# Altium footprint library LimeMicroAltiumLib_pcbLib.PcbLib: 281 footprints (part 16 of 18)
Each footprint in its own frame and in the unit in brackets; x right, y up, seen from the top. Pads: shape width x height; smd on the part's side, far side on the other; paste and mask are expansions set on the pad; w line width, h text height; cw(c..) or ccw(c..) is an arc to the next point about the centre after c.
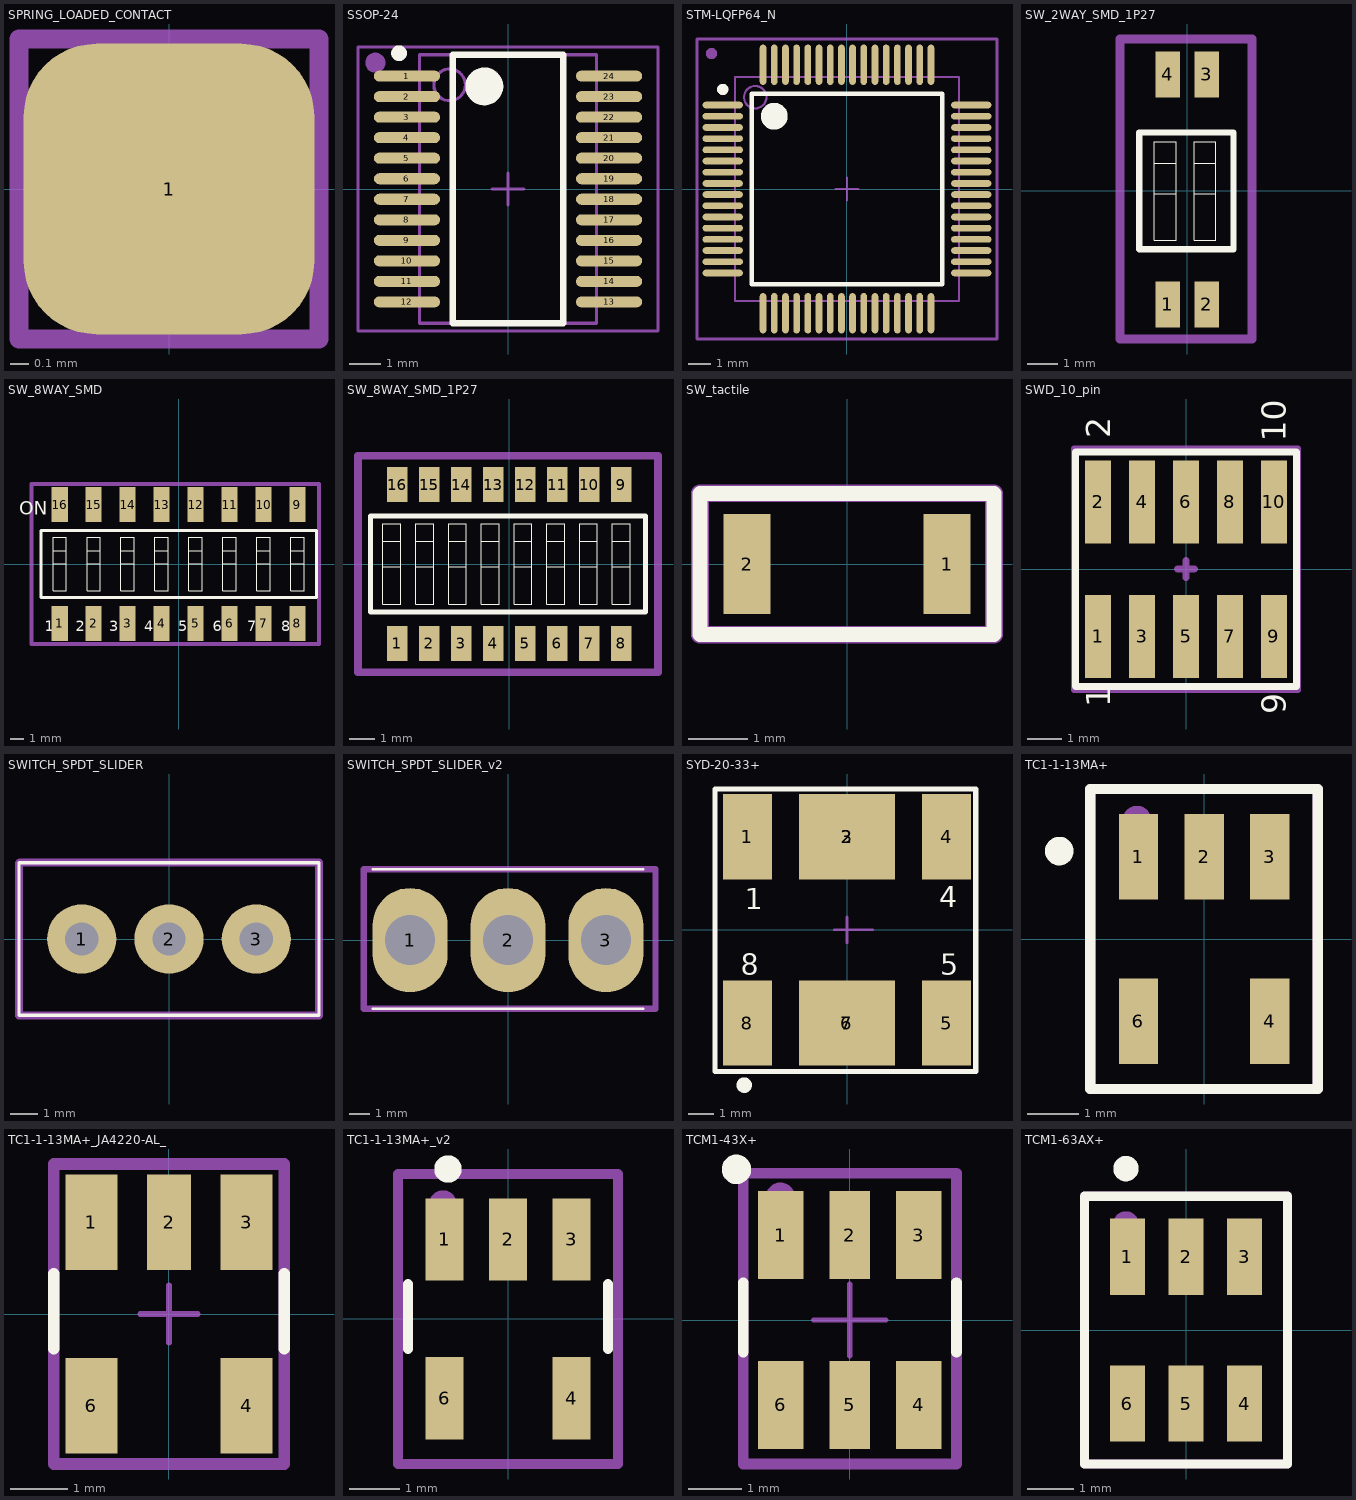
[diagram p15: the footprints below, top view; thin cyan lines are the x and y axes]

## SPRING_LOADED_CONTACT [mm]
pads (1):
  rrect50% 1.55x1.55 smd mask+0.05: 1(0,0)
Mechanical 15:
  lines w0.1: -0.425,0 0,0 ; 0,-0.425 0,0 ; 0,0.425 0,0 ; 0.425,0 0,0 ; -0.8,-0.8 0.8,-0.8 0.8,0.8 -0.8,0.8 -0.8,-0.8
  text ".Designator" at 0,0 h0.55
3D body: height 4, standoff 2, extent -0.3,-0.3 0.3,0.3
3D body: height 2, standoff 0, extent -0.6,-0.6 0.6,0.6

## SSOP-24 [mm] "SOP, 24-Leads, Body 8,5x5,6mm (max), Pitch 0,65mm, IPC Medium Density"
height 2
pads (24):
  oval 2.1x0.35 smd: 1(-3.2,3.575) 2(-3.2,2.925) 3(-3.2,2.275) 4(-3.2,1.625) 5(-3.2,0.975) 6(-3.2,0.325) 7(-3.2,-0.325) 8(-3.2,-0.975) 9(-3.2,-1.625) 10(-3.2,-2.275) 11(-3.2,-2.925) 12(-3.2,-3.575) 13(3.2,-3.575) 14(3.2,-2.925) 15(3.2,-2.275) 16(3.2,-1.625) 17(3.2,-0.975) 18(3.2,-0.325) 19(3.2,0.325) 20(3.2,0.975) 21(3.2,1.625) 22(3.2,2.275) 23(3.2,2.925) 24(3.2,3.575)
Top Overlay:
  circle w0.25: c-3.45,4.3 r0.125
  circle w0.6: c-0.75,3.25 r0.3
  lines w0.2: -1.75,-4.25 -1.75,4.25 1.75,4.25 1.75,-4.25 -1.75,-4.25
Mechanical 13:
  circle w0.1: c-1.85,3.3 r0.5
  lines w0.1: -2.8,-4.25 -2.8,4.25 2.8,4.25 2.8,-4.25 -2.8,-4.25
Mechanical 15:
  circle w0.35: c-4.2,4 r0.141
  lines w0.1: -0.5,0 0.5,0 ; 0,-0.5 0,0.5 ; -4.75,-4.5 -4.75,4.5 4.75,4.5 4.75,-4.5 -4.75,-4.5
  text ".designator" at 0,0 h0.7
3D body "SOP65P640X110-24N.STEP": height 1.2, standoff 0, extent -3.25,-3.95 3.25,3.95

## STM-LQFP64_N [mm] "Thin QFP, 64-Leads, Body 10x10mm, Pitch 0.5mm, IPC Medium Density"
height 1.6
pads (64):
  oval 1.8x0.3 smd mask+0.05: 1(-5.55,3.75) 2(-5.55,3.25) 3(-5.55,2.75) 4(-5.55,2.25) 5(-5.55,1.75) 6(-5.55,1.25) 7(-5.55,0.75) 8(-5.55,0.25) 9(-5.55,-0.25) 10(-5.55,-0.75) 11(-5.55,-1.25) 12(-5.55,-1.75) 13(-5.55,-2.25) 14(-5.55,-2.75) 15(-5.55,-3.25) 16(-5.55,-3.75) 33(5.55,-3.75) 34(5.55,-3.25) 35(5.55,-2.75) 36(5.55,-2.25) 37(5.55,-1.75) 38(5.55,-1.25) 39(5.55,-0.75) 40(5.55,-0.25) 41(5.55,0.25) 42(5.55,0.75) 43(5.55,1.25) 44(5.55,1.75) 45(5.55,2.25) 46(5.55,2.75) 47(5.55,3.25) 48(5.55,3.75)
  oval 0.3x1.8 smd mask+0.05: 17(-3.75,-5.55) 18(-3.25,-5.55) 19(-2.75,-5.55) 20(-2.25,-5.55) 21(-1.75,-5.55) 22(-1.25,-5.55) 23(-0.75,-5.55) 24(-0.25,-5.55) 25(0.25,-5.55) 26(0.75,-5.55) 27(1.25,-5.55) 28(1.75,-5.55) 29(2.25,-5.55) 30(2.75,-5.55) 31(3.25,-5.55) 32(3.75,-5.55) 49(3.75,5.55) 50(3.25,5.55) 51(2.75,5.55) 52(2.25,5.55) 53(1.75,5.55) 54(1.25,5.55) 55(0.75,5.55) 56(0.25,5.55) 57(-0.25,5.55) 58(-0.75,5.55) 59(-1.25,5.55) 60(-1.75,5.55) 61(-2.25,5.55) 62(-2.75,5.55) 63(-3.25,5.55) 64(-3.75,5.55)
Top Overlay:
  circle w0.25: c-5.55,4.45 r0.125
  circle w0.6: c-3.25,3.25 r0.3
  lines w0.2: -4.25,-4.25 -4.25,4.25 4.25,4.25 4.25,-4.25 -4.25,-4.25
Mechanical 13:
  circle w0.1: c-4.1,4.1 r0.5
  lines w0.1: -5,-5 -5,5 5,5 5,-5 -5,-5
Mechanical 15:
  circle w0.25: c-6.05,6.05 r0.125
  lines w0.1: -0.5,0 0.5,0 ; 0,-0.5 0,0.5
  lines w0.15: -6.7,-6.7 -6.7,6.7 6.7,6.7 6.7,-6.7 -6.7,-6.7
  text ".Designator" at 0,0 h0.7
3D body "LQFP-64.STEP": height 1.6, standoff 0, extent -6,-6 6,6

## SW_2WAY_SMD_1P27 [mm] "DIP Switch; 16 Leads, 1.27 pitch"
height 5.06
pads (4):
  rect 0.8x1.5 smd: 1(-0.635,-3.7) 2(0.635,-3.7) 3(0.635,3.8) 4(-0.635,3.8)
Top Overlay:
  lines w0.025: -1.075,-0.1 -0.365,-0.1 ; -1.075,0.9 -0.365,0.9 ; 0.225,-0.1 0.935,-0.1 ; 0.225,0.9 0.935,0.9 ; -1.075,-1.6 -1.075,1.6 -0.365,1.6 -0.365,-1.6 -1.075,-1.6 ; 0.225,-1.6 0.935,-1.6 0.935,1.6 0.225,1.6 0.225,-1.6
  lines w0.2: -1.565,-1.9 -1.565,1.9 1.51,1.9 1.51,-1.9 -1.565,-1.9
Mechanical 15:
  lines w0.3: -2.19,-4.825 -2.19,4.95 2.11,4.95 2.11,-4.825 -2.19,-4.825
  text "1" at -0.79,-3.4 h1
  text ".Designator" at -0.115,-0.1 h0.7
3D body "switch_a-dshp-02.stp": height 1.9, standoff 0, extent -1.79,-4 1.79,4

## SW_8WAY_SMD [mm] "DIP Switch; 16 Leads"
height 5.06
pads (16):
  rect 1.2x2.6 smd: 1(-8.89,-4.45) 2(-6.35,-4.45) 3(-3.81,-4.45) 4(-1.27,-4.45) 5(1.27,-4.45) 6(3.81,-4.45) 7(6.35,-4.45) 8(8.89,-4.45) 9(8.89,4.45) 10(6.35,4.45) 11(3.81,4.45) 12(1.27,4.45) 13(-1.27,4.45) 14(-3.81,4.45) 15(-6.35,4.45) 16(-8.89,4.45)
Top Overlay:
  lines w0.025: -9.39,0 -8.39,0 ; -9.39,1 -8.39,1 ; -6.85,0 -5.85,0 ; -6.85,1 -5.85,1 ; -4.31,0 -3.31,0 ; -4.31,1 -3.31,1 ; -1.77,0 -0.77,0 ; -1.77,1 -0.77,1 ; 0.77,0 1.77,0 ; 0.77,1 1.77,1 ; 3.31,0 4.31,0 ; 3.31,1 4.31,1 ; 5.85,0 6.85,0 ; 5.85,1 6.85,1 ; 8.39,0 9.39,0 ; 8.39,1 9.39,1 ; -9.39,-2 -9.39,2 -8.39,2 -8.39,-2 -9.39,-2 ; -6.85,-2 -6.85,2 -5.85,2 -5.85,-2 -6.85,-2 ; -4.31,-2 -4.31,2 -3.31,2 -3.31,-2 -4.31,-2 ; -1.77,-2 -1.77,2 -0.77,2 -0.77,-2 -1.77,-2 ; 0.77,-2 0.77,2 1.77,2 1.77,-2 0.77,-2 ; 3.31,-2 3.31,2 4.31,2 4.31,-2 3.31,-2 ; 5.85,-2 5.85,2 6.85,2 6.85,-2 5.85,-2 ; 8.39,-2 8.39,2 9.39,2 9.39,-2 8.39,-2
  lines w0.2: -10.29,-2.5 -10.29,2.5 10.31,2.5 10.31,-2.5 -10.29,-2.5
  text "6" at 2.569,-5.032 h0.8
  text "5" at -0.031,-5.032 h0.8
  text "4" at -2.556,-5.032 h0.8
  text "3" at -5.181,-5.032 h0.8
  text "2" at -7.681,-5.032 h0.8
  text "1" at -10.006,-5.032 h0.8
  text "ON" at -11.938,3.678 h1
  text "7" at 5.119,-5.032 h0.8
  text "8" at 7.659,-5.032 h0.8
Mechanical 15:
  lines w0.3: -11,-6 -11,6 10.5,6 10.5,-6 -11,-6
  text ".Designator" at 0,0 h0.7
3D body "19728.stp": height 3.7, standoff 0, extent -10.63,-4.9 10.63,4.9

## SW_8WAY_SMD_1P27 [mm] "DIP Switch; 16 Leads, 1.27 pitch"
height 5.06
pads (16):
  rect 0.8x1.4 smd: 1(-4.445,-3.15) 2(-3.175,-3.15) 3(-1.905,-3.15) 4(-0.635,-3.15) 5(0.635,-3.15) 6(1.905,-3.15) 7(3.175,-3.15) 8(4.445,-3.15) 9(4.445,3.15) 10(3.175,3.15) 11(1.905,3.15) 12(0.635,3.15) 13(-0.635,3.15) 14(-1.905,3.15) 15(-3.175,3.15) 16(-4.445,3.15)
Top Overlay:
  lines w0.025: -5.01,-0.1 -4.3,-0.1 ; -5.01,0.9 -4.3,0.9 ; -3.71,-0.1 -3,-0.1 ; -3.71,0.9 -3,0.9 ; -2.41,-0.1 -1.7,-0.1 ; -2.41,0.9 -1.7,0.9 ; -1.11,-0.1 -0.4,-0.1 ; -1.11,0.9 -0.4,0.9 ; 0.19,-0.1 0.9,-0.1 ; 0.19,0.9 0.9,0.9 ; 1.49,-0.1 2.2,-0.1 ; 1.49,0.9 2.2,0.9 ; 2.79,-0.1 3.5,-0.1 ; 2.79,0.9 3.5,0.9 ; 4.09,-0.1 4.8,-0.1 ; 4.09,0.9 4.8,0.9 ; -5.01,-1.6 -4.3,-1.6 -4.3,1.6 -5.01,1.6 -5.01,-1.6 ; -3.71,-1.6 -3.71,1.6 -3,1.6 -3,-1.6 -3.71,-1.6 ; -2.41,-1.6 -1.7,-1.6 -1.7,1.6 -2.41,1.6 -2.41,-1.6 ; -1.11,-1.6 -1.11,1.6 -0.4,1.6 -0.4,-1.6 -1.11,-1.6 ; 0.19,-1.6 0.9,-1.6 0.9,1.6 0.19,1.6 0.19,-1.6 ; 1.49,-1.6 1.49,1.6 2.2,1.6 2.2,-1.6 1.49,-1.6 ; 2.79,-1.6 2.79,1.6 3.5,1.6 3.5,-1.6 2.79,-1.6 ; 4.09,-1.6 4.8,-1.6 4.8,1.6 4.09,1.6 4.09,-1.6
  lines w0.2: -5.5,-1.9 5.4,-1.9 5.4,1.9 -5.5,1.9 -5.5,-1.9
Mechanical 15:
  lines w0.3: -6,-4.3 5.9,-4.3 5.9,4.3 -6,4.3 -6,-4.3
  text ".Designator" at 0,0 h0.7
  text "1" at -4.6,-3.4 h1
  text "8" at 4.445,-3.15 h1
3D body "A6H_8101.step": height 1.55, standoff 0, extent -5.695,-3.3 5.695,3.4

## SW_tactile [mm]
pads (2):
  rect 0.8x1.7 smd: 1(1.7,0) 2(-1.7,0)
Top Overlay:
  lines w0.254: -2.5,-1.2 -2.5,1.2 2.5,1.2 2.5,-1.2 -2.5,-1.2
Mechanical 15:
  lines w0.3: -2.5,-1.2 2.5,-1.2 2.5,1.2 -2.5,1.2 -2.5,-1.2
  text ".Designator" at 0,0 h0.7
3D body: height 2, standoff 1, extent -1,-1 1,1
3D body: height 1, standoff 0, extent -1.7,-1.1 1.7,1.1

## SWD_10_pin [mm]
pads (10):
  rect 0.75x2.4 smd: 1(-2.55,-1.95) 2(-2.55,1.95) 3(-1.275,-1.95) 4(-1.275,1.95) 5(0,-1.95) 6(0,1.95) 7(1.275,-1.95) 8(1.275,1.95) 9(2.55,-1.95) 10(2.55,1.95)
Top Overlay:
  lines w0.2: -3.2,-3.4 3.2,-3.4 3.2,3.4 -3.2,3.4 -3.2,-3.4
  text "10" at 2.9,3.7 h0.7
  text "2" at -2.2,3.8 h0.7
  text "9" at 2.9,-4.2 h0.7
  text "1" at -2.2,-4 h0.7
Mechanical 15:
  lines w0.17: -3.25,-3.5 3.25,-3.5 3.25,3.5 -3.25,3.5 -3.25,-3.5
  lines w0.2: -0.25,0 0.25,0 ; 0,-0.25 0,0.25
  text ".designator" at 0,0 h1
3D body "pin_header_a-sl127-dg-g02mp1.stp": height 6.37, standoff -0.03, extent 1.905,-2.752 3.175,2.752
3D body "pin_header_a-sl127-dg-g02mp1.stp": height 6.37, standoff -0.03, extent 0.635,-2.752 1.905,2.752
3D body "pin_header_a-sl127-dg-g02mp1.stp": height 6.37, standoff -0.03, extent -0.635,-2.752 0.635,2.752
3D body "pin_header_a-sl127-dg-g02mp1.stp": height 6.37, standoff -0.03, extent -1.905,-2.752 -0.635,2.752
3D body "pin_header_a-sl127-dg-g02mp1.stp": height 6.37, standoff -0.03, extent -3.175,-2.752 -1.905,2.752

## SWITCH_SPDT_SLIDER [mil] "TE Connectivity SLS121PC04 SPDT slider"
height 396
pads (3):
  round 100 hole 48: 1(-126,0) 2(0,0) 3(126,0)
Top Overlay:
  lines w5: -216.54,-110.24 -216.54,110.24 216.54,110.24 216.54,-110.24 -216.54,-110.24
Mechanical 15:
  lines w11.81: -216.54,-110.24 -216.54,109.25 -215.55,110.24 216.54,110.24 216.54,-110.24 -216.54,-110.24
  text ".Designator" at 0,0 h27.56
3D body "Slide Switch SLS121PC04.STEP": height 394, standoff -170, extent -216.49,-109.99 216.51,110.01

## SWITCH_SPDT_SLIDER_v2 [mm] "TE Connectivity SLS121PC04 SPDT slider"
height 10.058
pads (3):
  oval 3.6x5 hole 2.4: 1(-4.7,0) 2(0,0) 3(4.7,0)
Top Overlay:
  lines w0.127: -6.5,-3.3 6.5,-3.3 ; -6.5,3.4 6.5,3.4
Mechanical 15:
  lines w0.3: -6.925,-3.3 -6.925,3.4 7.075,3.4 7.075,-3.3 -6.925,-3.3
  text ".Designator" at 0,0 h0.7
3D body: height -0.5, standoff -4.5, extent -5.7,-0.999 -3.7,1
3D body: height -0.5, standoff -4.5, extent -1,-0.999 1,1
3D body: height -0.5, standoff -4.5, extent 3.7,-0.999 5.7,1
3D body: height 11.4, standoff 6.35, extent -3.437,-2.125 0.437,2.125
3D body: height 6.35, standoff 0, extent -6.55,-3.35 6.55,3.35

## SYD-20-33+ [mm]
height 0.6
pads (8):
  rect 1.9x3.3 smd mask+0.05: 1(-3.85,3.6) 4(3.85,3.6) 5(3.85,-3.6) 8(-3.85,-3.6)
  rect 3.7x3.3 smd mask+0.05: 2(0,3.6) 3(0,3.6) 6(0,-3.6) 7(0,-3.6)
Top Overlay:
  circle w0.3: c-3.975,-6 r0.15
  lines w0.2: -5.1,-5.475 -5.1,5.45 4.975,5.45 4.975,-5.475 -5.1,-5.475
  text "8" at -4.1,-1.725 h0.8
  text "5" at 3.6,-1.725 h0.8
  text "4" at 3.575,0.875 h0.8
  text "1" at -3.95,0.8 h0.8
Mechanical 13:
  lines w0.1: -5.1,-5.475 4.975,-5.475 4.975,5.45 -5.1,5.45 -5.1,-5.475
Mechanical 15:
  lines w0.05: -5.1,-5.45 5,-5.45 5,5.45 -5.1,5.45 -5.1,-5.45
  lines w0.1: -0.5,0 1,0 ; 0,-0.5 0,0.5
  text "1" at -3.95,0.825 h0.8
  text "4" at 3.6,0.85 h0.8
  text "5" at 3.575,-1.725 h0.8
  text "8" at -4.075,-1.75 h0.8
  text ".Designator" at 0,0 h0.7
3D body: height 6.35, standoff 0, extent -6.35,-4.8 6.35,4.8

## TC1-1-13MA+ [mm] "Balun"
pads (5):
  rect 0.76x1.65 smd: 1(-1.27,1.59) 2(0,1.59) 3(1.27,1.59) 4(1.27,-1.59) 6(-1.27,-1.59)
Top Overlay:
  circle w0.35: c-2.8,1.7 r0.1
  lines w0.2: -2.2,-2.9 -2.2,2.9 2.2,2.9 2.2,-2.9 -2.2,-2.9
Mechanical 15:
  circle w0.35: c-1.3,2.3 r0.1
  lines w0.2: -2.2,-2.9 -2.2,2.9 2.2,2.9 2.2,-2.9 -2.2,-2.9
  text ".designator" at 0,0 h0.9
3D body: height 1, standoff 0, extent -1.275,-1.612 1.275,1.613
3D body "User Library-LQW2BH.step": height 2.8, standoff 1, extent -0.75,-1 0.75,1

## TC1-1-13MA+_JA4220-AL_ [mm] "Balun compatible with TC1-1-13MA+ and JA4220-AL_"
pads (5):
  rect 0.9x1.65 smd: 1(-1.345,1.59) 3(1.345,1.59) 4(1.345,-1.59) 6(-1.345,-1.59)
  rect 0.76x1.65 smd: 2(0,1.59)
Top Overlay:
  lines w0.2: -2,-0.6 -2,0.7 ; 2,-0.6 2,0.7
Mechanical 13:
  text "NC" at -0.2,2.8 h0.2
  text "Sec" at 1,2.8 h0.2
  text "Sec*" at -1.7,2.8 h0.2
  text "Pri" at 1.1,-3 h0.2
  text "Pri*" at -1.7,-3 h0.2
Mechanical 15:
  circle w0.35: c-1.35,1.65 r0.1
  lines w0.1: -0.5,0 0,0 ; 0,-0.5 0,0 ; 0,0.5 0,0 ; 0.5,0 0,0
  lines w0.2: -2,-2.6 2,-2.6 2,2.6 -2,2.6 -2,-2.6
  text ".designator" at 0,0 h0.55
3D body: height 1, standoff 0, extent -1.275,-1.612 1.275,1.613
3D body "User Library-LQW2BH.step": height 2.8, standoff 1, extent -0.75,-1 0.75,1

## TC1-1-13MA+_v2 [mm] "Balun"
pads (5):
  rect 0.76x1.65 smd: 1(-1.27,1.59) 2(0,1.59) 3(1.27,1.59) 4(1.27,-1.59) 6(-1.27,-1.59)
Top Overlay:
  circle w0.35: c-1.2,3 r0.1
  lines w0.2: -2,-0.6 -2,0.7 ; 2,-0.6 2,0.7
Mechanical 15:
  circle w0.35: c-1.3,2.3 r0.1
  lines w0.2: -2.2,-2.9 -2.2,2.9 2.2,2.9 2.2,-2.9 -2.2,-2.9
  text ".designator" at 0,0 h0.9
3D body "User Library-LQW2BH.step": height 2.8, standoff 1, extent -0.75,-1 0.75,1
3D body: height 1, standoff 0, extent -1.275,-1.612 1.275,1.613

## TCM1-43X+ [mm] "Balun"
pads (6):
  rect 0.85x1.65 smd: 1(-1.295,1.59) 3(1.295,1.59) 4(1.295,-1.59) 6(-1.295,-1.59)
  rect 0.76x1.65 smd: 2(0,1.59) 5(0,-1.59)
Top Overlay:
  circle w0.35: c-2.125,2.825 r0.1
  lines w0.2: -2,-0.6 -2,0.7 ; 2,-0.6 2,0.7
Mechanical 15:
  circle w0.35: c-1.3,2.3 r0.1
  lines w0.1: -0.675,0 0,0 ; 0,-0.675 0,0 ; 0,0.675 0,0 ; 0.675,0 0,0
  lines w0.2: -2,-2.7 2,-2.7 2,2.75 -2,2.75 -2,-2.7
  text ".designator" at 0,0 h0.55
3D body "User Library-LQW2BH.step": height 2.8, standoff 1, extent -0.75,-1 0.75,1
3D body: height 1, standoff 0, extent -1.275,-1.612 1.275,1.613

## TCM1-63AX+ [mm] "Balun"
pads (6):
  rect 0.76x1.65 smd: 1(-1.27,1.59) 2(0,1.59) 3(1.27,1.59) 4(1.27,-1.59) 5(0,-1.59) 6(-1.27,-1.59)
Top Overlay:
  circle w0.35: c-1.3,3.5 r0.1
  lines w0.2: -2.2,-2.9 -2.2,2.9 2.2,2.9 2.2,-2.9 -2.2,-2.9
Mechanical 15:
  circle w0.35: c-1.3,2.3 r0.1
  lines w0.2: -2.2,-2.9 -2.2,2.9 2.2,2.9 2.2,-2.9 -2.2,-2.9
  text ".designator" at 0,0 h0.9
3D body: height 1, standoff 0, extent -1.275,-1.612 1.275,1.613
3D body "User Library-LQW2BH.step": height 2.8, standoff 1, extent -0.75,-1 0.75,1